# Altium footprint library ST封装.PcbLib: 1336 footprints (part 30 of 109)
Each footprint in its own frame and in the unit in brackets; x right, y up, seen from the top. Pads: shape width x height; smd on the part's side, far side on the other; paste and mask are expansions set on the pad; w line width, h text height; cw(c..) or ccw(c..) is an arc to the next point about the centre after c.
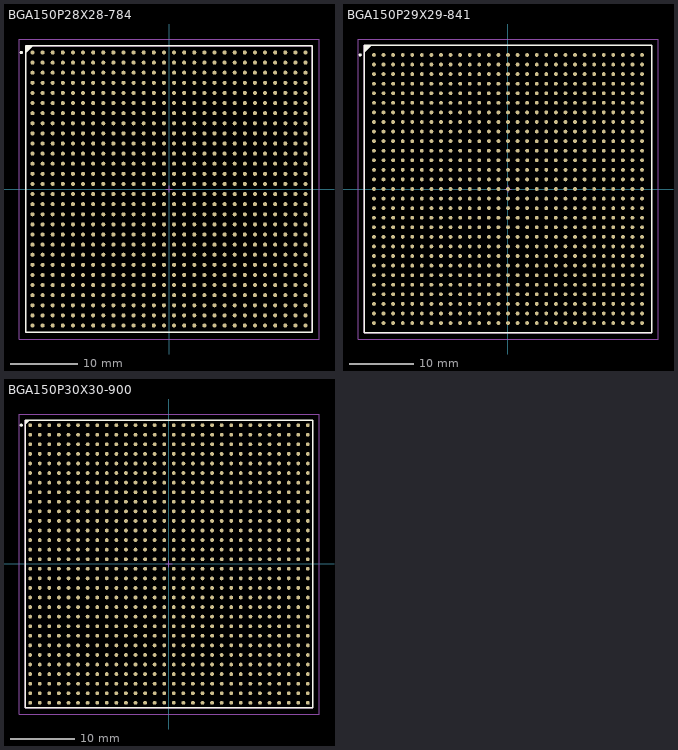
[diagram p29: the footprints below, top view; thin cyan lines are the x and y axes]

## BGA150P28X28-784 [mm] "BGA, 784-Leads, Body 42.5x42.5mm, Pitch 1.5mm"
height 3.5
pads (784):
  round 0.6 smd: A1(-20.25,20.25) A2(-18.75,20.25) A3(-17.25,20.25) A4(-15.75,20.25) A5(-14.25,20.25) A6(-12.75,20.25) A7(-11.25,20.25) A8(-9.75,20.25) A9(-8.25,20.25) A10(-6.75,20.25) A11(-5.25,20.25) A12(-3.75,20.25) A13(-2.25,20.25) A14(-0.75,20.25) A15(0.75,20.25) A16(2.25,20.25) A17(3.75,20.25) A18(5.25,20.25) A19(6.75,20.25) A20(8.25,20.25) A21(9.75,20.25) A22(11.25,20.25) A23(12.75,20.25) A24(14.25,20.25) A25(15.75,20.25) A26(17.25,20.25) A27(18.75,20.25) A28(20.25,20.25) AA1(-20.25,-9.75) AA2(-18.75,-9.75) AA3(-17.25,-9.75) AA4(-15.75,-9.75) AA5(-14.25,-9.75) AA6(-12.75,-9.75) AA7(-11.25,-9.75) AA8(-9.75,-9.75) AA9(-8.25,-9.75) AA10(-6.75,-9.75) AA11(-5.25,-9.75) AA12(-3.75,-9.75) AA13(-2.25,-9.75) AA14(-0.75,-9.75) AA15(0.75,-9.75) AA16(2.25,-9.75) AA17(3.75,-9.75) AA18(5.25,-9.75) AA19(6.75,-9.75) AA20(8.25,-9.75) AA21(9.75,-9.75) AA22(11.25,-9.75) AA23(12.75,-9.75) AA24(14.25,-9.75) AA25(15.75,-9.75) AA26(17.25,-9.75) AA27(18.75,-9.75) AA28(20.25,-9.75) AB1(-20.25,-11.25) AB2(-18.75,-11.25) AB3(-17.25,-11.25) AB4(-15.75,-11.25) AB5(-14.25,-11.25) AB6(-12.75,-11.25) AB7(-11.25,-11.25) AB8(-9.75,-11.25) AB9(-8.25,-11.25) AB10(-6.75,-11.25) AB11(-5.25,-11.25) AB12(-3.75,-11.25) AB13(-2.25,-11.25) AB14(-0.75,-11.25) AB15(0.75,-11.25) AB16(2.25,-11.25) AB17(3.75,-11.25) AB18(5.25,-11.25) AB19(6.75,-11.25) AB20(8.25,-11.25) AB21(9.75,-11.25) AB22(11.25,-11.25) AB23(12.75,-11.25) AB24(14.25,-11.25) AB25(15.75,-11.25) AB26(17.25,-11.25) AB27(18.75,-11.25) AB28(20.25,-11.25) AC1(-20.25,-12.75) AC2(-18.75,-12.75) AC3(-17.25,-12.75) AC4(-15.75,-12.75) AC5(-14.25,-12.75) AC6(-12.75,-12.75) AC7(-11.25,-12.75) AC8(-9.75,-12.75) AC9(-8.25,-12.75) AC10(-6.75,-12.75) AC11(-5.25,-12.75) AC12(-3.75,-12.75) AC13(-2.25,-12.75) AC14(-0.75,-12.75) AC15(0.75,-12.75) AC16(2.25,-12.75) AC17(3.75,-12.75) AC18(5.25,-12.75) AC19(6.75,-12.75) AC20(8.25,-12.75) AC21(9.75,-12.75) AC22(11.25,-12.75) AC23(12.75,-12.75) AC24(14.25,-12.75) AC25(15.75,-12.75) AC26(17.25,-12.75) AC27(18.75,-12.75) AC28(20.25,-12.75) AD1(-20.25,-14.25) AD2(-18.75,-14.25) AD3(-17.25,-14.25) AD4(-15.75,-14.25) AD5(-14.25,-14.25) AD6(-12.75,-14.25) AD7(-11.25,-14.25) AD8(-9.75,-14.25) AD9(-8.25,-14.25) AD10(-6.75,-14.25) AD11(-5.25,-14.25) AD12(-3.75,-14.25) AD13(-2.25,-14.25) AD14(-0.75,-14.25) AD15(0.75,-14.25) AD16(2.25,-14.25) AD17(3.75,-14.25) AD18(5.25,-14.25) AD19(6.75,-14.25) AD20(8.25,-14.25) AD21(9.75,-14.25) AD22(11.25,-14.25) AD23(12.75,-14.25) AD24(14.25,-14.25) AD25(15.75,-14.25) AD26(17.25,-14.25) AD27(18.75,-14.25) AD28(20.25,-14.25) AE1(-20.25,-15.75) AE2(-18.75,-15.75) AE3(-17.25,-15.75) AE4(-15.75,-15.75) AE5(-14.25,-15.75) AE6(-12.75,-15.75) AE7(-11.25,-15.75) AE8(-9.75,-15.75) AE9(-8.25,-15.75) AE10(-6.75,-15.75) AE11(-5.25,-15.75) AE12(-3.75,-15.75) AE13(-2.25,-15.75) AE14(-0.75,-15.75) AE15(0.75,-15.75) AE16(2.25,-15.75) AE17(3.75,-15.75) AE18(5.25,-15.75) AE19(6.75,-15.75) AE20(8.25,-15.75) AE21(9.75,-15.75) AE22(11.25,-15.75) AE23(12.75,-15.75) AE24(14.25,-15.75) AE25(15.75,-15.75) AE26(17.25,-15.75) AE27(18.75,-15.75) AE28(20.25,-15.75) AF1(-20.25,-17.25) AF2(-18.75,-17.25) AF3(-17.25,-17.25) AF4(-15.75,-17.25) AF5(-14.25,-17.25) AF6(-12.75,-17.25) AF7(-11.25,-17.25) AF8(-9.75,-17.25) AF9(-8.25,-17.25) AF10(-6.75,-17.25) AF11(-5.25,-17.25) AF12(-3.75,-17.25) AF13(-2.25,-17.25) AF14(-0.75,-17.25) AF15(0.75,-17.25) AF16(2.25,-17.25) AF17(3.75,-17.25) AF18(5.25,-17.25) AF19(6.75,-17.25) AF20(8.25,-17.25) AF21(9.75,-17.25) AF22(11.25,-17.25) AF23(12.75,-17.25) AF24(14.25,-17.25) AF25(15.75,-17.25) AF26(17.25,-17.25) AF27(18.75,-17.25) AF28(20.25,-17.25) AG1(-20.25,-18.75) AG2(-18.75,-18.75) AG3(-17.25,-18.75) AG4(-15.75,-18.75) AG5(-14.25,-18.75) AG6(-12.75,-18.75) AG7(-11.25,-18.75) AG8(-9.75,-18.75) AG9(-8.25,-18.75) AG10(-6.75,-18.75) AG11(-5.25,-18.75) AG12(-3.75,-18.75) AG13(-2.25,-18.75) AG14(-0.75,-18.75) AG15(0.75,-18.75) AG16(2.25,-18.75) AG17(3.75,-18.75) AG18(5.25,-18.75) AG19(6.75,-18.75) AG20(8.25,-18.75) AG21(9.75,-18.75) AG22(11.25,-18.75) AG23(12.75,-18.75) AG24(14.25,-18.75) AG25(15.75,-18.75) AG26(17.25,-18.75) AG27(18.75,-18.75) AG28(20.25,-18.75) AH1(-20.25,-20.25) AH2(-18.75,-20.25) AH3(-17.25,-20.25) AH4(-15.75,-20.25) AH5(-14.25,-20.25) AH6(-12.75,-20.25) AH7(-11.25,-20.25) AH8(-9.75,-20.25) AH9(-8.25,-20.25) AH10(-6.75,-20.25) AH11(-5.25,-20.25) AH12(-3.75,-20.25) AH13(-2.25,-20.25) AH14(-0.75,-20.25) AH15(0.75,-20.25) AH16(2.25,-20.25) AH17(3.75,-20.25) AH18(5.25,-20.25) AH19(6.75,-20.25) AH20(8.25,-20.25) AH21(9.75,-20.25) AH22(11.25,-20.25) AH23(12.75,-20.25) AH24(14.25,-20.25) AH25(15.75,-20.25) AH26(17.25,-20.25) AH27(18.75,-20.25) AH28(20.25,-20.25) B1(-20.25,18.75) B2(-18.75,18.75) B3(-17.25,18.75) B4(-15.75,18.75) B5(-14.25,18.75) B6(-12.75,18.75) B7(-11.25,18.75) B8(-9.75,18.75) B9(-8.25,18.75) B10(-6.75,18.75) B11(-5.25,18.75) B12(-3.75,18.75) B13(-2.25,18.75) B14(-0.75,18.75) B15(0.75,18.75) B16(2.25,18.75) B17(3.75,18.75) B18(5.25,18.75) B19(6.75,18.75) B20(8.25,18.75) B21(9.75,18.75) B22(11.25,18.75) B23(12.75,18.75) B24(14.25,18.75) B25(15.75,18.75) B26(17.25,18.75) B27(18.75,18.75) B28(20.25,18.75) C1(-20.25,17.25) C2(-18.75,17.25) C3(-17.25,17.25) C4(-15.75,17.25) C5(-14.25,17.25) C6(-12.75,17.25) C7(-11.25,17.25) C8(-9.75,17.25) C9(-8.25,17.25) C10(-6.75,17.25) C11(-5.25,17.25) C12(-3.75,17.25) C13(-2.25,17.25) C14(-0.75,17.25) C15(0.75,17.25) C16(2.25,17.25) C17(3.75,17.25) C18(5.25,17.25) C19(6.75,17.25) C20(8.25,17.25) C21(9.75,17.25) C22(11.25,17.25) C23(12.75,17.25) C24(14.25,17.25) C25(15.75,17.25) C26(17.25,17.25) C27(18.75,17.25) C28(20.25,17.25) D1(-20.25,15.75) D2(-18.75,15.75) D3(-17.25,15.75) D4(-15.75,15.75) D5(-14.25,15.75) D6(-12.75,15.75) D7(-11.25,15.75) D8(-9.75,15.75) D9(-8.25,15.75) D10(-6.75,15.75) D11(-5.25,15.75) D12(-3.75,15.75) D13(-2.25,15.75) D14(-0.75,15.75) D15(0.75,15.75) D16(2.25,15.75) D17(3.75,15.75) D18(5.25,15.75) D19(6.75,15.75) D20(8.25,15.75) D21(9.75,15.75) D22(11.25,15.75) D23(12.75,15.75) D24(14.25,15.75) D25(15.75,15.75) D26(17.25,15.75) D27(18.75,15.75) D28(20.25,15.75) E1(-20.25,14.25) E2(-18.75,14.25) E3(-17.25,14.25) E4(-15.75,14.25) E5(-14.25,14.25) E6(-12.75,14.25) E7(-11.25,14.25) E8(-9.75,14.25) E9(-8.25,14.25) E10(-6.75,14.25) E11(-5.25,14.25) E12(-3.75,14.25) E13(-2.25,14.25) E14(-0.75,14.25) E15(0.75,14.25) E16(2.25,14.25) E17(3.75,14.25) E18(5.25,14.25) E19(6.75,14.25) E20(8.25,14.25) E21(9.75,14.25) E22(11.25,14.25) E23(12.75,14.25) E24(14.25,14.25) E25(15.75,14.25) E26(17.25,14.25) E27(18.75,14.25) E28(20.25,14.25) F1(-20.25,12.75) F2(-18.75,12.75) F3(-17.25,12.75) F4(-15.75,12.75) F5(-14.25,12.75) F6(-12.75,12.75) F7(-11.25,12.75) F8(-9.75,12.75) F9(-8.25,12.75) F10(-6.75,12.75) F11(-5.25,12.75) F12(-3.75,12.75) F13(-2.25,12.75) F14(-0.75,12.75) F15(0.75,12.75) F16(2.25,12.75) F17(3.75,12.75) F18(5.25,12.75) F19(6.75,12.75) F20(8.25,12.75) F21(9.75,12.75) F22(11.25,12.75) F23(12.75,12.75) F24(14.25,12.75) F25(15.75,12.75) F26(17.25,12.75) F27(18.75,12.75) F28(20.25,12.75) G1(-20.25,11.25) G2(-18.75,11.25) G3(-17.25,11.25) G4(-15.75,11.25) G5(-14.25,11.25) G6(-12.75,11.25) G7(-11.25,11.25) G8(-9.75,11.25) G9(-8.25,11.25) G10(-6.75,11.25) G11(-5.25,11.25) G12(-3.75,11.25) G13(-2.25,11.25) G14(-0.75,11.25) G15(0.75,11.25) G16(2.25,11.25) G17(3.75,11.25) G18(5.25,11.25) G19(6.75,11.25) G20(8.25,11.25) G21(9.75,11.25) G22(11.25,11.25) G23(12.75,11.25) G24(14.25,11.25) G25(15.75,11.25) G26(17.25,11.25) G27(18.75,11.25) G28(20.25,11.25) H1(-20.25,9.75) H2(-18.75,9.75) H3(-17.25,9.75) H4(-15.75,9.75) H5(-14.25,9.75) H6(-12.75,9.75) H7(-11.25,9.75) H8(-9.75,9.75) H9(-8.25,9.75) H10(-6.75,9.75) H11(-5.25,9.75) H12(-3.75,9.75) H13(-2.25,9.75) H14(-0.75,9.75) H15(0.75,9.75) H16(2.25,9.75) H17(3.75,9.75) H18(5.25,9.75) H19(6.75,9.75) H20(8.25,9.75) H21(9.75,9.75) H22(11.25,9.75) H23(12.75,9.75) H24(14.25,9.75) H25(15.75,9.75) H26(17.25,9.75) H27(18.75,9.75) H28(20.25,9.75) J1(-20.25,8.25) J2(-18.75,8.25) J3(-17.25,8.25) J4(-15.75,8.25) J5(-14.25,8.25) J6(-12.75,8.25) J7(-11.25,8.25) J8(-9.75,8.25) J9(-8.25,8.25) J10(-6.75,8.25) J11(-5.25,8.25) J12(-3.75,8.25) J13(-2.25,8.25) J14(-0.75,8.25) J15(0.75,8.25) J16(2.25,8.25) J17(3.75,8.25) J18(5.25,8.25) J19(6.75,8.25) J20(8.25,8.25) J21(9.75,8.25) J22(11.25,8.25) J23(12.75,8.25) J24(14.25,8.25) J25(15.75,8.25) J26(17.25,8.25) J27(18.75,8.25) J28(20.25,8.25) K1(-20.25,6.75) K2(-18.75,6.75) K3(-17.25,6.75) K4(-15.75,6.75) K5(-14.25,6.75) K6(-12.75,6.75) K7(-11.25,6.75) K8(-9.75,6.75) K9(-8.25,6.75) K10(-6.75,6.75) K11(-5.25,6.75) K12(-3.75,6.75) K13(-2.25,6.75) K14(-0.75,6.75) K15(0.75,6.75) K16(2.25,6.75) K17(3.75,6.75) K18(5.25,6.75) K19(6.75,6.75) K20(8.25,6.75) K21(9.75,6.75) K22(11.25,6.75) K23(12.75,6.75) K24(14.25,6.75) K25(15.75,6.75) K26(17.25,6.75) K27(18.75,6.75) K28(20.25,6.75) L1(-20.25,5.25) L2(-18.75,5.25) L3(-17.25,5.25) L4(-15.75,5.25) L5(-14.25,5.25) L6(-12.75,5.25) L7(-11.25,5.25) L8(-9.75,5.25) L9(-8.25,5.25) L10(-6.75,5.25) L11(-5.25,5.25) L12(-3.75,5.25) L13(-2.25,5.25) L14(-0.75,5.25) L15(0.75,5.25) L16(2.25,5.25) L17(3.75,5.25) L18(5.25,5.25) L19(6.75,5.25) L20(8.25,5.25) L21(9.75,5.25) L22(11.25,5.25) L23(12.75,5.25) L24(14.25,5.25) L25(15.75,5.25) L26(17.25,5.25) L27(18.75,5.25) L28(20.25,5.25) M1(-20.25,3.75) M2(-18.75,3.75) M3(-17.25,3.75) M4(-15.75,3.75) M5(-14.25,3.75) M6(-12.75,3.75) M7(-11.25,3.75) M8(-9.75,3.75) M9(-8.25,3.75) M10(-6.75,3.75) M11(-5.25,3.75) M12(-3.75,3.75) M13(-2.25,3.75) M14(-0.75,3.75) M15(0.75,3.75) M16(2.25,3.75) M17(3.75,3.75) M18(5.25,3.75) M19(6.75,3.75) M20(8.25,3.75) M21(9.75,3.75) M22(11.25,3.75) M23(12.75,3.75) M24(14.25,3.75) M25(15.75,3.75) M26(17.25,3.75) M27(18.75,3.75) M28(20.25,3.75) N1(-20.25,2.25) N2(-18.75,2.25) N3(-17.25,2.25) N4(-15.75,2.25) N5(-14.25,2.25) N6(-12.75,2.25) N7(-11.25,2.25) N8(-9.75,2.25) N9(-8.25,2.25) N10(-6.75,2.25) N11(-5.25,2.25) N12(-3.75,2.25) N13(-2.25,2.25) N14(-0.75,2.25) N15(0.75,2.25) N16(2.25,2.25) N17(3.75,2.25) N18(5.25,2.25) N19(6.75,2.25) N20(8.25,2.25) N21(9.75,2.25) N22(11.25,2.25) N23(12.75,2.25) N24(14.25,2.25) N25(15.75,2.25) N26(17.25,2.25) N27(18.75,2.25) N28(20.25,2.25) P1(-20.25,0.75) P2(-18.75,0.75) P3(-17.25,0.75) P4(-15.75,0.75) P5(-14.25,0.75) P6(-12.75,0.75) P7(-11.25,0.75) P8(-9.75,0.75) P9(-8.25,0.75) P10(-6.75,0.75) P11(-5.25,0.75) P12(-3.75,0.75) P13(-2.25,0.75) P14(-0.75,0.75) P15(0.75,0.75) P16(2.25,0.75) P17(3.75,0.75) P18(5.25,0.75) P19(6.75,0.75) P20(8.25,0.75) P21(9.75,0.75) P22(11.25,0.75) P23(12.75,0.75) P24(14.25,0.75) P25(15.75,0.75) P26(17.25,0.75) P27(18.75,0.75) P28(20.25,0.75) R1(-20.25,-0.75) R2(-18.75,-0.75) R3(-17.25,-0.75) R4(-15.75,-0.75) R5(-14.25,-0.75) R6(-12.75,-0.75) R7(-11.25,-0.75) R8(-9.75,-0.75) R9(-8.25,-0.75) R10(-6.75,-0.75) R11(-5.25,-0.75) R12(-3.75,-0.75) R13(-2.25,-0.75) R14(-0.75,-0.75) R15(0.75,-0.75) R16(2.25,-0.75) R17(3.75,-0.75) R18(5.25,-0.75) R19(6.75,-0.75) R20(8.25,-0.75) R21(9.75,-0.75) R22(11.25,-0.75) R23(12.75,-0.75) R24(14.25,-0.75) R25(15.75,-0.75) R26(17.25,-0.75) R27(18.75,-0.75) R28(20.25,-0.75) T1(-20.25,-2.25) T2(-18.75,-2.25) T3(-17.25,-2.25) T4(-15.75,-2.25) T5(-14.25,-2.25) T6(-12.75,-2.25) T7(-11.25,-2.25) T8(-9.75,-2.25) T9(-8.25,-2.25) T10(-6.75,-2.25) T11(-5.25,-2.25) T12(-3.75,-2.25) T13(-2.25,-2.25) T14(-0.75,-2.25) T15(0.75,-2.25) T16(2.25,-2.25) T17(3.75,-2.25) T18(5.25,-2.25) T19(6.75,-2.25) T20(8.25,-2.25) T21(9.75,-2.25) T22(11.25,-2.25) T23(12.75,-2.25) T24(14.25,-2.25) T25(15.75,-2.25) T26(17.25,-2.25) T27(18.75,-2.25) T28(20.25,-2.25) U1(-20.25,-3.75) U2(-18.75,-3.75) U3(-17.25,-3.75) U4(-15.75,-3.75) U5(-14.25,-3.75) U6(-12.75,-3.75) U7(-11.25,-3.75) U8(-9.75,-3.75) U9(-8.25,-3.75) U10(-6.75,-3.75) U11(-5.25,-3.75) U12(-3.75,-3.75) U13(-2.25,-3.75) U14(-0.75,-3.75) U15(0.75,-3.75) U16(2.25,-3.75) U17(3.75,-3.75) U18(5.25,-3.75) U19(6.75,-3.75) U20(8.25,-3.75) U21(9.75,-3.75) U22(11.25,-3.75) U23(12.75,-3.75) U24(14.25,-3.75) U25(15.75,-3.75) U26(17.25,-3.75) U27(18.75,-3.75) U28(20.25,-3.75) V1(-20.25,-5.25) V2(-18.75,-5.25) V3(-17.25,-5.25) V4(-15.75,-5.25) V5(-14.25,-5.25) V6(-12.75,-5.25) V7(-11.25,-5.25) V8(-9.75,-5.25) V9(-8.25,-5.25) V10(-6.75,-5.25) V11(-5.25,-5.25) V12(-3.75,-5.25) V13(-2.25,-5.25) V14(-0.75,-5.25) V15(0.75,-5.25) V16(2.25,-5.25) V17(3.75,-5.25) V18(5.25,-5.25) V19(6.75,-5.25) V20(8.25,-5.25) V21(9.75,-5.25) V22(11.25,-5.25) V23(12.75,-5.25) V24(14.25,-5.25) V25(15.75,-5.25) V26(17.25,-5.25) V27(18.75,-5.25) V28(20.25,-5.25) W1(-20.25,-6.75) W2(-18.75,-6.75) W3(-17.25,-6.75) W4(-15.75,-6.75) W5(-14.25,-6.75) W6(-12.75,-6.75) W7(-11.25,-6.75) W8(-9.75,-6.75) W9(-8.25,-6.75) W10(-6.75,-6.75) W11(-5.25,-6.75) W12(-3.75,-6.75) W13(-2.25,-6.75) W14(-0.75,-6.75) W15(0.75,-6.75) W16(2.25,-6.75) W17(3.75,-6.75) W18(5.25,-6.75) W19(6.75,-6.75) W20(8.25,-6.75) W21(9.75,-6.75) W22(11.25,-6.75) W23(12.75,-6.75) W24(14.25,-6.75) W25(15.75,-6.75) W26(17.25,-6.75) W27(18.75,-6.75) W28(20.25,-6.75) Y1(-20.25,-8.25) Y2(-18.75,-8.25) Y3(-17.25,-8.25) Y4(-15.75,-8.25) Y5(-14.25,-8.25) Y6(-12.75,-8.25) Y7(-11.25,-8.25) Y8(-9.75,-8.25) Y9(-8.25,-8.25) Y10(-6.75,-8.25) Y11(-5.25,-8.25) Y12(-3.75,-8.25) Y13(-2.25,-8.25) Y14(-0.75,-8.25) Y15(0.75,-8.25) Y16(2.25,-8.25) Y17(3.75,-8.25) Y18(5.25,-8.25) Y19(6.75,-8.25) Y20(8.25,-8.25) Y21(9.75,-8.25) Y22(11.25,-8.25) Y23(12.75,-8.25) Y24(14.25,-8.25) Y25(15.75,-8.25) Y26(17.25,-8.25) Y27(18.75,-8.25) Y28(20.25,-8.25)
Top Overlay:
  circle w0.25: c-21.9,20.25 r0.125
  region: -20.25,21.25 -21.25,20.25 -21.25,21.25
  lines w0.2: -21.25,20.25 -20.25,21.25 ; -21.25,-21.25 21.25,-21.25 21.25,21.25 -21.25,21.25 -21.25,-21.25
Mechanical 13:
  lines w0.1: -21.25,-21.25 21.25,-21.25 21.25,21.25 -21.25,21.25 -21.25,-21.25
Mechanical 15:
  lines w0.1: -0.5,0 0.5,0 ; 0,-0.5 0,0.5 ; -22.25,-22.25 22.25,-22.25 22.25,22.25 -22.25,22.25 -22.25,-22.25
3D body: height 3.5, standoff 0, extent -21.25,-21.25 21.25,21.25

## BGA150P29X29-841 [mm] "BGA, 841-Leads, Body 45x45mm, Pitch 1.5mm"
height 3.5
pads (841):
  round 0.6 smd: A1(-21,21) A2(-19.5,21) A3(-18,21) A4(-16.5,21) A5(-15,21) A6(-13.5,21) A7(-12,21) A8(-10.5,21) A9(-9,21) A10(-7.5,21) A11(-6,21) A12(-4.5,21) A13(-3,21) A14(-1.5,21) A15(0,21) A16(1.5,21) A17(3,21) A18(4.5,21) A19(6,21) A20(7.5,21) A21(9,21) A22(10.5,21) A23(12,21) A24(13.5,21) A25(15,21) A26(16.5,21) A27(18,21) A28(19.5,21) A29(21,21) AA1(-21,-9) AA2(-19.5,-9) AA3(-18,-9) AA4(-16.5,-9) AA5(-15,-9) AA6(-13.5,-9) AA7(-12,-9) AA8(-10.5,-9) AA9(-9,-9) AA10(-7.5,-9) AA11(-6,-9) AA12(-4.5,-9) AA13(-3,-9) AA14(-1.5,-9) AA15(0,-9) AA16(1.5,-9) AA17(3,-9) AA18(4.5,-9) AA19(6,-9) AA20(7.5,-9) AA21(9,-9) AA22(10.5,-9) AA23(12,-9) AA24(13.5,-9) AA25(15,-9) AA26(16.5,-9) AA27(18,-9) AA28(19.5,-9) AA29(21,-9) AB1(-21,-10.5) AB2(-19.5,-10.5) AB3(-18,-10.5) AB4(-16.5,-10.5) AB5(-15,-10.5) AB6(-13.5,-10.5) AB7(-12,-10.5) AB8(-10.5,-10.5) AB9(-9,-10.5) AB10(-7.5,-10.5) AB11(-6,-10.5) AB12(-4.5,-10.5) AB13(-3,-10.5) AB14(-1.5,-10.5) AB15(0,-10.5) AB16(1.5,-10.5) AB17(3,-10.5) AB18(4.5,-10.5) AB19(6,-10.5) AB20(7.5,-10.5) AB21(9,-10.5) AB22(10.5,-10.5) AB23(12,-10.5) AB24(13.5,-10.5) AB25(15,-10.5) AB26(16.5,-10.5) AB27(18,-10.5) AB28(19.5,-10.5) AB29(21,-10.5) AC1(-21,-12) AC2(-19.5,-12) AC3(-18,-12) AC4(-16.5,-12) AC5(-15,-12) AC6(-13.5,-12) AC7(-12,-12) AC8(-10.5,-12) AC9(-9,-12) AC10(-7.5,-12) AC11(-6,-12) AC12(-4.5,-12) AC13(-3,-12) AC14(-1.5,-12) AC15(0,-12) AC16(1.5,-12) AC17(3,-12) AC18(4.5,-12) AC19(6,-12) AC20(7.5,-12) AC21(9,-12) AC22(10.5,-12) AC23(12,-12) AC24(13.5,-12) AC25(15,-12) AC26(16.5,-12) AC27(18,-12) AC28(19.5,-12) AC29(21,-12) AD1(-21,-13.5) AD2(-19.5,-13.5) AD3(-18,-13.5) AD4(-16.5,-13.5) AD5(-15,-13.5) AD6(-13.5,-13.5) AD7(-12,-13.5) AD8(-10.5,-13.5) AD9(-9,-13.5) AD10(-7.5,-13.5) AD11(-6,-13.5) AD12(-4.5,-13.5) AD13(-3,-13.5) AD14(-1.5,-13.5) AD15(0,-13.5) AD16(1.5,-13.5) AD17(3,-13.5) AD18(4.5,-13.5) AD19(6,-13.5) AD20(7.5,-13.5) AD21(9,-13.5) AD22(10.5,-13.5) AD23(12,-13.5) AD24(13.5,-13.5) AD25(15,-13.5) AD26(16.5,-13.5) AD27(18,-13.5) AD28(19.5,-13.5) AD29(21,-13.5) AE1(-21,-15) AE2(-19.5,-15) AE3(-18,-15) AE4(-16.5,-15) AE5(-15,-15) AE6(-13.5,-15) AE7(-12,-15) AE8(-10.5,-15) AE9(-9,-15) AE10(-7.5,-15) AE11(-6,-15) AE12(-4.5,-15) AE13(-3,-15) AE14(-1.5,-15) AE15(0,-15) AE16(1.5,-15) AE17(3,-15) AE18(4.5,-15) AE19(6,-15) AE20(7.5,-15) AE21(9,-15) AE22(10.5,-15) AE23(12,-15) AE24(13.5,-15) AE25(15,-15) AE26(16.5,-15) AE27(18,-15) AE28(19.5,-15) AE29(21,-15) AF1(-21,-16.5) AF2(-19.5,-16.5) AF3(-18,-16.5) AF4(-16.5,-16.5) AF5(-15,-16.5) AF6(-13.5,-16.5) AF7(-12,-16.5) AF8(-10.5,-16.5) AF9(-9,-16.5) AF10(-7.5,-16.5) AF11(-6,-16.5) AF12(-4.5,-16.5) AF13(-3,-16.5) AF14(-1.5,-16.5) AF15(0,-16.5) AF16(1.5,-16.5) AF17(3,-16.5) AF18(4.5,-16.5) AF19(6,-16.5) AF20(7.5,-16.5) AF21(9,-16.5) AF22(10.5,-16.5) AF23(12,-16.5) AF24(13.5,-16.5) AF25(15,-16.5) AF26(16.5,-16.5) AF27(18,-16.5) AF28(19.5,-16.5) AF29(21,-16.5) AG1(-21,-18) AG2(-19.5,-18) AG3(-18,-18) AG4(-16.5,-18) AG5(-15,-18) AG6(-13.5,-18) AG7(-12,-18) AG8(-10.5,-18) AG9(-9,-18) AG10(-7.5,-18) AG11(-6,-18) AG12(-4.5,-18) AG13(-3,-18) AG14(-1.5,-18) AG15(0,-18) AG16(1.5,-18) AG17(3,-18) AG18(4.5,-18) AG19(6,-18) AG20(7.5,-18) AG21(9,-18) AG22(10.5,-18) AG23(12,-18) AG24(13.5,-18) AG25(15,-18) AG26(16.5,-18) AG27(18,-18) AG28(19.5,-18) AG29(21,-18) AH1(-21,-19.5) AH2(-19.5,-19.5) AH3(-18,-19.5) AH4(-16.5,-19.5) AH5(-15,-19.5) AH6(-13.5,-19.5) AH7(-12,-19.5) AH8(-10.5,-19.5) AH9(-9,-19.5) AH10(-7.5,-19.5) AH11(-6,-19.5) AH12(-4.5,-19.5) AH13(-3,-19.5) AH14(-1.5,-19.5) AH15(0,-19.5) AH16(1.5,-19.5) AH17(3,-19.5) AH18(4.5,-19.5) AH19(6,-19.5) AH20(7.5,-19.5) AH21(9,-19.5) AH22(10.5,-19.5) AH23(12,-19.5) AH24(13.5,-19.5) AH25(15,-19.5) AH26(16.5,-19.5) AH27(18,-19.5) AH28(19.5,-19.5) AH29(21,-19.5) AJ1(-21,-21) AJ2(-19.5,-21) AJ3(-18,-21) AJ4(-16.5,-21) AJ5(-15,-21) AJ6(-13.5,-21) AJ7(-12,-21) AJ8(-10.5,-21) AJ9(-9,-21) AJ10(-7.5,-21) AJ11(-6,-21) AJ12(-4.5,-21) AJ13(-3,-21) AJ14(-1.5,-21) AJ15(0,-21) AJ16(1.5,-21) AJ17(3,-21) AJ18(4.5,-21) AJ19(6,-21) AJ20(7.5,-21) AJ21(9,-21) AJ22(10.5,-21) AJ23(12,-21) AJ24(13.5,-21) AJ25(15,-21) AJ26(16.5,-21) AJ27(18,-21) AJ28(19.5,-21) AJ29(21,-21) B1(-21,19.5) B2(-19.5,19.5) B3(-18,19.5) B4(-16.5,19.5) B5(-15,19.5) B6(-13.5,19.5) B7(-12,19.5) B8(-10.5,19.5) B9(-9,19.5) B10(-7.5,19.5) B11(-6,19.5) B12(-4.5,19.5) B13(-3,19.5) B14(-1.5,19.5) B15(0,19.5) B16(1.5,19.5) B17(3,19.5) B18(4.5,19.5) B19(6,19.5) B20(7.5,19.5) B21(9,19.5) B22(10.5,19.5) B23(12,19.5) B24(13.5,19.5) B25(15,19.5) B26(16.5,19.5) B27(18,19.5) B28(19.5,19.5) B29(21,19.5) C1(-21,18) C2(-19.5,18) C3(-18,18) C4(-16.5,18) C5(-15,18) C6(-13.5,18) C7(-12,18) C8(-10.5,18) C9(-9,18) C10(-7.5,18) C11(-6,18) C12(-4.5,18) C13(-3,18) C14(-1.5,18) C15(0,18) C16(1.5,18) C17(3,18) C18(4.5,18) C19(6,18) C20(7.5,18) C21(9,18) C22(10.5,18) C23(12,18) C24(13.5,18) C25(15,18) C26(16.5,18) C27(18,18) C28(19.5,18) C29(21,18) D1(-21,16.5) D2(-19.5,16.5) D3(-18,16.5) D4(-16.5,16.5) D5(-15,16.5) D6(-13.5,16.5) D7(-12,16.5) D8(-10.5,16.5) D9(-9,16.5) D10(-7.5,16.5) D11(-6,16.5) D12(-4.5,16.5) D13(-3,16.5) D14(-1.5,16.5) D15(0,16.5) D16(1.5,16.5) D17(3,16.5) D18(4.5,16.5) D19(6,16.5) D20(7.5,16.5) D21(9,16.5) D22(10.5,16.5) D23(12,16.5) D24(13.5,16.5) D25(15,16.5) D26(16.5,16.5) D27(18,16.5) D28(19.5,16.5) D29(21,16.5) E1(-21,15) E2(-19.5,15) E3(-18,15) E4(-16.5,15) E5(-15,15) E6(-13.5,15) E7(-12,15) E8(-10.5,15) E9(-9,15) E10(-7.5,15) E11(-6,15) E12(-4.5,15) E13(-3,15) E14(-1.5,15) E15(0,15) E16(1.5,15) E17(3,15) E18(4.5,15) E19(6,15) E20(7.5,15) E21(9,15) E22(10.5,15) E23(12,15) E24(13.5,15) E25(15,15) E26(16.5,15) E27(18,15) E28(19.5,15) E29(21,15) F1(-21,13.5) F2(-19.5,13.5) F3(-18,13.5) F4(-16.5,13.5) F5(-15,13.5) F6(-13.5,13.5) F7(-12,13.5) F8(-10.5,13.5) F9(-9,13.5) F10(-7.5,13.5) F11(-6,13.5) F12(-4.5,13.5) F13(-3,13.5) F14(-1.5,13.5) F15(0,13.5) F16(1.5,13.5) F17(3,13.5) F18(4.5,13.5) F19(6,13.5) F20(7.5,13.5) F21(9,13.5) F22(10.5,13.5) F23(12,13.5) F24(13.5,13.5) F25(15,13.5) F26(16.5,13.5) F27(18,13.5) F28(19.5,13.5) F29(21,13.5) G1(-21,12) G2(-19.5,12) G3(-18,12) G4(-16.5,12) G5(-15,12) G6(-13.5,12) G7(-12,12) G8(-10.5,12) G9(-9,12) G10(-7.5,12) G11(-6,12) G12(-4.5,12) G13(-3,12) G14(-1.5,12) G15(0,12) G16(1.5,12) G17(3,12) G18(4.5,12) G19(6,12) G20(7.5,12) G21(9,12) G22(10.5,12) G23(12,12) G24(13.5,12) G25(15,12) G26(16.5,12) G27(18,12) G28(19.5,12) G29(21,12) H1(-21,10.5) H2(-19.5,10.5) H3(-18,10.5) H4(-16.5,10.5) H5(-15,10.5) H6(-13.5,10.5) H7(-12,10.5) H8(-10.5,10.5) H9(-9,10.5) H10(-7.5,10.5) H11(-6,10.5) H12(-4.5,10.5) H13(-3,10.5) H14(-1.5,10.5) H15(0,10.5) H16(1.5,10.5) H17(3,10.5) H18(4.5,10.5) H19(6,10.5) H20(7.5,10.5) H21(9,10.5) H22(10.5,10.5) H23(12,10.5) H24(13.5,10.5) H25(15,10.5) H26(16.5,10.5) H27(18,10.5) H28(19.5,10.5) H29(21,10.5) J1(-21,9) J2(-19.5,9) J3(-18,9) J4(-16.5,9) J5(-15,9) J6(-13.5,9) J7(-12,9) J8(-10.5,9) J9(-9,9) J10(-7.5,9) J11(-6,9) J12(-4.5,9) J13(-3,9) J14(-1.5,9) J15(0,9) J16(1.5,9) J17(3,9) J18(4.5,9) J19(6,9) J20(7.5,9) J21(9,9) J22(10.5,9) J23(12,9) J24(13.5,9) J25(15,9) J26(16.5,9) J27(18,9) J28(19.5,9) J29(21,9) K1(-21,7.5) K2(-19.5,7.5) K3(-18,7.5) K4(-16.5,7.5) K5(-15,7.5) K6(-13.5,7.5) K7(-12,7.5) K8(-10.5,7.5) K9(-9,7.5) K10(-7.5,7.5) K11(-6,7.5) K12(-4.5,7.5) K13(-3,7.5) K14(-1.5,7.5) K15(0,7.5) K16(1.5,7.5) K17(3,7.5) K18(4.5,7.5) K19(6,7.5) K20(7.5,7.5) K21(9,7.5) K22(10.5,7.5) K23(12,7.5) K24(13.5,7.5) K25(15,7.5) K26(16.5,7.5) K27(18,7.5) K28(19.5,7.5) K29(21,7.5) L1(-21,6) L2(-19.5,6) L3(-18,6) L4(-16.5,6) L5(-15,6) L6(-13.5,6) L7(-12,6) L8(-10.5,6) L9(-9,6) L10(-7.5,6) L11(-6,6) L12(-4.5,6) L13(-3,6) L14(-1.5,6) L15(0,6) L16(1.5,6) L17(3,6) L18(4.5,6) L19(6,6) L20(7.5,6) L21(9,6) L22(10.5,6) L23(12,6) L24(13.5,6) L25(15,6) L26(16.5,6) L27(18,6) L28(19.5,6) L29(21,6) M1(-21,4.5) M2(-19.5,4.5) M3(-18,4.5) M4(-16.5,4.5) M5(-15,4.5) M6(-13.5,4.5) M7(-12,4.5) M8(-10.5,4.5) M9(-9,4.5) M10(-7.5,4.5) M11(-6,4.5) M12(-4.5,4.5) M13(-3,4.5) M14(-1.5,4.5) M15(0,4.5) M16(1.5,4.5) M17(3,4.5) M18(4.5,4.5) M19(6,4.5) M20(7.5,4.5) M21(9,4.5) M22(10.5,4.5) M23(12,4.5) M24(13.5,4.5) M25(15,4.5) M26(16.5,4.5) M27(18,4.5) M28(19.5,4.5) M29(21,4.5) N1(-21,3) N2(-19.5,3) N3(-18,3) N4(-16.5,3) N5(-15,3) N6(-13.5,3) N7(-12,3) N8(-10.5,3) N9(-9,3) N10(-7.5,3) N11(-6,3) N12(-4.5,3) N13(-3,3) N14(-1.5,3) N15(0,3) N16(1.5,3) N17(3,3) N18(4.5,3) N19(6,3) N20(7.5,3) N21(9,3) N22(10.5,3) N23(12,3) N24(13.5,3) N25(15,3) N26(16.5,3) N27(18,3) N28(19.5,3) N29(21,3) P1(-21,1.5) P2(-19.5,1.5) P3(-18,1.5) P4(-16.5,1.5) P5(-15,1.5) P6(-13.5,1.5) P7(-12,1.5) P8(-10.5,1.5) P9(-9,1.5) P10(-7.5,1.5) P11(-6,1.5) P12(-4.5,1.5) P13(-3,1.5) P14(-1.5,1.5) P15(0,1.5) P16(1.5,1.5) P17(3,1.5) P18(4.5,1.5) P19(6,1.5) P20(7.5,1.5) P21(9,1.5) P22(10.5,1.5) P23(12,1.5) P24(13.5,1.5) P25(15,1.5) P26(16.5,1.5) P27(18,1.5) P28(19.5,1.5) P29(21,1.5) R1(-21,0) R2(-19.5,0) R3(-18,0) R4(-16.5,0) R5(-15,0) R6(-13.5,0) R7(-12,0) R8(-10.5,0) R9(-9,0) R10(-7.5,0) R11(-6,0) R12(-4.5,0) R13(-3,0) R14(-1.5,0) R15(0,0) R16(1.5,0) R17(3,0) R18(4.5,0) R19(6,0) R20(7.5,0) R21(9,0) R22(10.5,0) R23(12,0) R24(13.5,0) R25(15,0) R26(16.5,0) R27(18,0) R28(19.5,0) R29(21,0) T1(-21,-1.5) T2(-19.5,-1.5) T3(-18,-1.5) T4(-16.5,-1.5) T5(-15,-1.5) T6(-13.5,-1.5) T7(-12,-1.5) T8(-10.5,-1.5) T9(-9,-1.5) T10(-7.5,-1.5) T11(-6,-1.5) T12(-4.5,-1.5) T13(-3,-1.5) T14(-1.5,-1.5) T15(0,-1.5) T16(1.5,-1.5) T17(3,-1.5) T18(4.5,-1.5) T19(6,-1.5) T20(7.5,-1.5) T21(9,-1.5) T22(10.5,-1.5) T23(12,-1.5) T24(13.5,-1.5) T25(15,-1.5) T26(16.5,-1.5) T27(18,-1.5) T28(19.5,-1.5) T29(21,-1.5) U1(-21,-3) U2(-19.5,-3) U3(-18,-3) U4(-16.5,-3) U5(-15,-3) U6(-13.5,-3) U7(-12,-3) U8(-10.5,-3) U9(-9,-3) U10(-7.5,-3) U11(-6,-3) U12(-4.5,-3) U13(-3,-3) U14(-1.5,-3) U15(0,-3) U16(1.5,-3) U17(3,-3) U18(4.5,-3) U19(6,-3) U20(7.5,-3) U21(9,-3) U22(10.5,-3) U23(12,-3) U24(13.5,-3) U25(15,-3) U26(16.5,-3) U27(18,-3) U28(19.5,-3) U29(21,-3) V1(-21,-4.5) V2(-19.5,-4.5) V3(-18,-4.5) V4(-16.5,-4.5) V5(-15,-4.5) V6(-13.5,-4.5) V7(-12,-4.5) V8(-10.5,-4.5) V9(-9,-4.5) V10(-7.5,-4.5) V11(-6,-4.5) V12(-4.5,-4.5) V13(-3,-4.5) V14(-1.5,-4.5) V15(0,-4.5) V16(1.5,-4.5) V17(3,-4.5) V18(4.5,-4.5) V19(6,-4.5) V20(7.5,-4.5) V21(9,-4.5) V22(10.5,-4.5) V23(12,-4.5) V24(13.5,-4.5) V25(15,-4.5) V26(16.5,-4.5) V27(18,-4.5) V28(19.5,-4.5) V29(21,-4.5) W1(-21,-6) W2(-19.5,-6) W3(-18,-6) W4(-16.5,-6) W5(-15,-6) W6(-13.5,-6) W7(-12,-6) W8(-10.5,-6) W9(-9,-6) W10(-7.5,-6) W11(-6,-6) W12(-4.5,-6) W13(-3,-6) W14(-1.5,-6) W15(0,-6) W16(1.5,-6) W17(3,-6) W18(4.5,-6) W19(6,-6) W20(7.5,-6) W21(9,-6) W22(10.5,-6) W23(12,-6) W24(13.5,-6) W25(15,-6) W26(16.5,-6) W27(18,-6) W28(19.5,-6) W29(21,-6) Y1(-21,-7.5) Y2(-19.5,-7.5) Y3(-18,-7.5) Y4(-16.5,-7.5) Y5(-15,-7.5) Y6(-13.5,-7.5) Y7(-12,-7.5) Y8(-10.5,-7.5) Y9(-9,-7.5) Y10(-7.5,-7.5) Y11(-6,-7.5) Y12(-4.5,-7.5) Y13(-3,-7.5) Y14(-1.5,-7.5) Y15(0,-7.5) Y16(1.5,-7.5) Y17(3,-7.5) Y18(4.5,-7.5) Y19(6,-7.5) Y20(7.5,-7.5) Y21(9,-7.5) Y22(10.5,-7.5) Y23(12,-7.5) Y24(13.5,-7.5) Y25(15,-7.5) Y26(16.5,-7.5) Y27(18,-7.5) Y28(19.5,-7.5) Y29(21,-7.5)